# Altium footprint library SAMTEC SMD.PcbLib: 165 footprints (part 11 of 17) (continued)
## SAMTEC_QTE-080-01-L-D-A-K-TR [mm] "160 Contacts Female, Pitch 0.8mm, Straight Double Row High Speed Ground Plane Header" (continued)
Mechanical 15:
  lines w0.05: -40.255,-4.06 -40.255,4.06 40.255,4.06 40.255,-4.06 -40.255,-4.06
3D body "SAMTEC_QTE-080-01-L-D-A-K-TR.stp": height 4.27, standoff -0.71, extent -40.005,-3.556 40.005,3.556

## SAMTEC_QTH-020-02-L-D-DP-A [mm] "40 Contacts (20 Differential Pairs) + 4 Ground, Pitch 0.5mm, Straight Double Row, High Speed Ground Plane Header"
height 7.26
pads (46):
  rect 0.305x1.45 smd mask+0: 3(-6.75,3.086) 4(-6.75,-3.086) 5(-6.25,3.086) 6(-6.25,-3.086) 9(-5.25,3.086) 10(-5.25,-3.086) 11(-4.75,3.086) 12(-4.75,-3.086) 15(-3.75,3.086) 16(-3.75,-3.086) 17(-3.25,3.086) 18(-3.25,-3.086) 21(-2.25,3.086) 22(-2.25,-3.086) 23(-1.75,3.086) 24(-1.75,-3.086) 27(-0.75,3.086) 28(-0.75,-3.086) 29(-0.25,3.086) 30(-0.25,-3.086) 33(0.75,3.086) 34(0.75,-3.086) 35(1.25,3.086) 36(1.25,-3.086) 39(2.25,3.086) 40(2.25,-3.086) 41(2.75,3.086) 42(2.75,-3.086) 45(3.75,3.086) 46(3.75,-3.086) 47(4.25,3.086) 48(4.25,-3.086) 51(5.25,3.086) 52(5.25,-3.086) 53(5.75,3.086) 54(5.75,-3.086) 57(6.75,3.086) 58(6.75,-3.086) 59(7.25,3.086) 60(7.25,-3.086)
  rect 2.54x0.64 smd mask+0: 61(-8.445,0) 64(8.445,0)
  rect 4.7x0.64 smd mask+0: 62(-3.175,0) 63(3.175,0)
  round 0.5 hole 1 unplated mask+0.25: 65(-9.24,2.036) 66(9.24,2.036)
Top Overlay:
  circle w0.25: c-7.892,4.047 r0.125
  lines w0.2: -10.013,-0.67 -10.013,-1.46 -8.489,-2.984 -7.253,-2.984 ; -10.013,0.67 -10.013,1.683 ; -10.013,2.389 -10.013,2.984 -7.253,2.984 ; -8.45,-0.67 -8.45,-1.968 -7.253,-1.968 ; -8.45,0.67 -8.45,1.722 ; -8.393,1.968 -7.253,1.968 ; -6.825,-0.191 -5.875,-0.191 ; -6.825,0.191 -5.875,0.191 ; -0.475,-0.191 0.475,-0.191 ; -0.475,0.191 0.475,0.191 ; 5.875,-0.191 6.825,-0.191 ; 5.875,0.191 6.825,0.191 ; 7.752,-2.984 8.478,-2.984 10.002,-1.46 10.002,-0.67 ; 7.752,-1.968 8.441,-1.968 8.441,-0.67 ; 7.752,1.968 8.393,1.968 ; 7.752,2.984 10.002,2.984 10.002,2.413 ; 8.441,0.67 8.441,1.746 ; 10.002,0.67 10.002,1.659
Mechanical 8:
  drawing of 279 lines, arcs and shapes, not listed
Mechanical 14:
  drawing of 203 lines, arcs and shapes, not listed
Mechanical 15:
  lines w0.05: -10.263,-4.061 -10.263,4.061 10.252,4.061 10.252,-4.061 -10.263,-4.061
3D body "SAMTEC_QTH-020-02-L-D-DP-A.stp": height 7.27, standoff -0.76, extent -10.013,-3.556 10.002,3.556

## SAMTEC_QTH-030-01-L-D-A [mm] "60 (2x30) Contacts, Pitch 0.5mm, Straight Double Row High Speed Ground Plane Header (Lead Style 4.27mm)"
height 4.27
pads (66):
  rect 0.305x1.45 smd mask+0: 1(-7.25,3.086) 2(-7.25,-3.086) 3(-6.75,3.086) 4(-6.75,-3.086) 5(-6.25,3.086) 6(-6.25,-3.086) 7(-5.75,3.086) 8(-5.75,-3.086) 9(-5.25,3.086) 10(-5.25,-3.086) 11(-4.75,3.086) 12(-4.75,-3.086) 13(-4.25,3.086) 14(-4.25,-3.086) 15(-3.75,3.086) 16(-3.75,-3.086) 17(-3.25,3.086) 18(-3.25,-3.086) 19(-2.75,3.086) 20(-2.75,-3.086) 21(-2.25,3.086) 22(-2.25,-3.086) 23(-1.75,3.086) 24(-1.75,-3.086) 25(-1.25,3.086) 26(-1.25,-3.086) 27(-0.75,3.086) 28(-0.75,-3.086) 29(-0.25,3.086) 30(-0.25,-3.086) 31(0.25,3.086) 32(0.25,-3.086) 33(0.75,3.086) 34(0.75,-3.086) 35(1.25,3.086) 36(1.25,-3.086) 37(1.75,3.086) 38(1.75,-3.086) 39(2.25,3.086) 40(2.25,-3.086) 41(2.75,3.086) 42(2.75,-3.086) 43(3.25,3.086) 44(3.25,-3.086) 45(3.75,3.086) 46(3.75,-3.086) 47(4.25,3.086) 48(4.25,-3.086) 49(4.75,3.086) 50(4.75,-3.086) 51(5.25,3.086) 52(5.25,-3.086) 53(5.75,3.086) 54(5.75,-3.086) 55(6.25,3.086) 56(6.25,-3.086) 57(6.75,3.086) 58(6.75,-3.086) 59(7.25,3.086) 60(7.25,-3.086)
  rect 2.54x0.64 smd mask+0: 61(-8.445,0) 64(8.445,0)
  rect 4.7x0.64 smd mask+0: 62(-3.175,0) 63(3.175,0)
  round 0.5 hole 1 unplated mask+0.25: 65(-9.24,2.036) 66(9.24,2.036)
Top Overlay:
  circle w0.25: c-7.892,4.047 r0.125
  lines w0.2: -8.447,-0.72 -8.447,-1.968 8.447,-1.968 8.447,-0.72 ; -8.447,0.72 -8.447,1.611 ; -8.342,1.968 8.343,1.968 ; -7.802,-2.985 -8.477,-2.985 -10.001,-1.46 -10.001,2.985 -7.802,2.985 ; 7.803,-2.985 8.477,-2.985 10.001,-1.46 10.001,2.985 7.803,2.985 ; 8.447,0.72 8.447,1.611
Mechanical 8:
  drawing of 399 lines, arcs and shapes, not listed
Mechanical 14:
  circle w0.1: c-7.89,4.047 r0.25
  lines w0.1: -8.731,-0.191 -8.731,-0.635 -9.747,-0.635 -9.747,0.635 -8.731,0.635 -8.731,0.191 ; -8.447,-0.572 -8.03,-0.572 -8.03,-0.193 ; -8.447,0.572 -8.03,0.572 -8.03,0.193 ; 8.447,-0.572 8.03,-0.572 8.03,0.572 8.447,0.572 ; 8.731,-0.191 8.731,-0.635 9.747,-0.635 9.747,0.635 8.731,0.635 8.731,0.191 ; -10.001,-1.46 -8.477,-2.985 8.477,-2.985 10.001,-1.46 10.001,2.985 -10.001,2.985 -10.001,-1.46 ; -9.461,-0.191 -9.461,0.191 9.462,0.191 9.462,-0.191 -9.461,-0.191 ; -8.447,-1.968 -8.447,1.968 8.447,1.968 8.447,-1.968 -8.447,-1.968
Mechanical 15:
  lines w0.1: -10.251,-4.061 -10.251,4.061 10.251,4.061 10.251,-4.061 -10.251,-4.061
3D body "SAMTEC_QTH-030-01-L-D-A.stp": height 4.27, standoff -0.74, extent -10.001,-3.569 10.001,3.569

## SAMTEC_QTH-030-02-L-D-A [mm] "60 (2x30) Contacts, Pitch 0.5mm, Straight Double Row High Speed Ground Plane Header (Lead Style 7.26mm)"
height 4.27
pads (66):
  rect 0.305x1.45 smd mask+0: 1(-7.25,3.086) 2(-7.25,-3.086) 3(-6.75,3.086) 4(-6.75,-3.086) 5(-6.25,3.086) 6(-6.25,-3.086) 7(-5.75,3.086) 8(-5.75,-3.086) 9(-5.25,3.086) 10(-5.25,-3.086) 11(-4.75,3.086) 12(-4.75,-3.086) 13(-4.25,3.086) 14(-4.25,-3.086) 15(-3.75,3.086) 16(-3.75,-3.086) 17(-3.25,3.086) 18(-3.25,-3.086) 19(-2.75,3.086) 20(-2.75,-3.086) 21(-2.25,3.086) 22(-2.25,-3.086) 23(-1.75,3.086) 24(-1.75,-3.086) 25(-1.25,3.086) 26(-1.25,-3.086) 27(-0.75,3.086) 28(-0.75,-3.086) 29(-0.25,3.086) 30(-0.25,-3.086) 31(0.25,3.086) 32(0.25,-3.086) 33(0.75,3.086) 34(0.75,-3.086) 35(1.25,3.086) 36(1.25,-3.086) 37(1.75,3.086) 38(1.75,-3.086) 39(2.25,3.086) 40(2.25,-3.086) 41(2.75,3.086) 42(2.75,-3.086) 43(3.25,3.086) 44(3.25,-3.086) 45(3.75,3.086) 46(3.75,-3.086) 47(4.25,3.086) 48(4.25,-3.086) 49(4.75,3.086) 50(4.75,-3.086) 51(5.25,3.086) 52(5.25,-3.086) 53(5.75,3.086) 54(5.75,-3.086) 55(6.25,3.086) 56(6.25,-3.086) 57(6.75,3.086) 58(6.75,-3.086) 59(7.25,3.086) 60(7.25,-3.086)
  rect 2.54x0.64 smd mask+0: 61(-8.445,0) 64(8.445,0)
  rect 4.7x0.64 smd mask+0: 62(-3.175,0) 63(3.175,0)
  round 0.5 hole 1 unplated mask+0.25: 65(-9.24,2.036) 66(9.24,2.036)
Top Overlay:
  circle w0.25: c-7.892,4.047 r0.125
  lines w0.2: -8.447,-0.72 -8.447,-1.968 8.447,-1.968 8.447,-0.72 ; -8.447,0.72 -8.447,1.611 ; -8.342,1.968 8.343,1.968 ; -7.802,-2.985 -8.477,-2.985 -10.001,-1.46 -10.001,2.985 -7.802,2.985 ; 7.803,-2.985 8.477,-2.985 10.001,-1.46 10.001,2.985 7.803,2.985 ; 8.447,0.72 8.447,1.611
Mechanical 8:
  drawing of 399 lines, arcs and shapes, not listed
Mechanical 14:
  circle w0.1: c-7.89,4.047 r0.25
  lines w0.1: -8.731,-0.191 -8.731,-0.635 -9.747,-0.635 -9.747,0.635 -8.731,0.635 -8.731,0.191 ; -8.447,-0.572 -8.03,-0.572 -8.03,-0.193 ; -8.447,0.572 -8.03,0.572 -8.03,0.193 ; 8.447,-0.572 8.03,-0.572 8.03,0.572 8.447,0.572 ; 8.731,-0.191 8.731,-0.635 9.747,-0.635 9.747,0.635 8.731,0.635 8.731,0.191 ; -10.001,-1.46 -8.477,-2.985 8.477,-2.985 10.001,-1.46 10.001,2.985 -10.001,2.985 -10.001,-1.46 ; -9.461,-0.191 -9.461,0.191 9.462,0.191 9.462,-0.191 -9.461,-0.191 ; -8.447,-1.968 -8.447,1.968 8.447,1.968 8.447,-1.968 -8.447,-1.968
Mechanical 15:
  lines w0.1: -10.251,-4.061 -10.251,4.061 10.251,4.061 10.251,-4.061 -10.251,-4.061
3D body "SAMTEC_QTH-030-02-L-D-A.stp": height 7.26, standoff -0.74, extent -10.001,-3.568 10.001,3.569

## SAMTEC_QTH-030-04-L-D-A [mm] "60 (2x30) Contacts, Pitch 0.5mm, Straight Double Row High Speed Ground Plane Header (Lead Style 15.25mm)"
height 15.25
pads (66):
  rect 0.305x1.45 smd mask+0: 1(-7.25,3.086) 2(-7.25,-3.086) 3(-6.75,3.086) 4(-6.75,-3.086) 5(-6.25,3.086) 6(-6.25,-3.086) 7(-5.75,3.086) 8(-5.75,-3.086) 9(-5.25,3.086) 10(-5.25,-3.086) 11(-4.75,3.086) 12(-4.75,-3.086) 13(-4.25,3.086) 14(-4.25,-3.086) 15(-3.75,3.086) 16(-3.75,-3.086) 17(-3.25,3.086) 18(-3.25,-3.086) 19(-2.75,3.086) 20(-2.75,-3.086) 21(-2.25,3.086) 22(-2.25,-3.086) 23(-1.75,3.086) 24(-1.75,-3.086) 25(-1.25,3.086) 26(-1.25,-3.086) 27(-0.75,3.086) 28(-0.75,-3.086) 29(-0.25,3.086) 30(-0.25,-3.086) 31(0.25,3.086) 32(0.25,-3.086) 33(0.75,3.086) 34(0.75,-3.086) 35(1.25,3.086) 36(1.25,-3.086) 37(1.75,3.086) 38(1.75,-3.086) 39(2.25,3.086) 40(2.25,-3.086) 41(2.75,3.086) 42(2.75,-3.086) 43(3.25,3.086) 44(3.25,-3.086) 45(3.75,3.086) 46(3.75,-3.086) 47(4.25,3.086) 48(4.25,-3.086) 49(4.75,3.086) 50(4.75,-3.086) 51(5.25,3.086) 52(5.25,-3.086) 53(5.75,3.086) 54(5.75,-3.086) 55(6.25,3.086) 56(6.25,-3.086) 57(6.75,3.086) 58(6.75,-3.086) 59(7.25,3.086) 60(7.25,-3.086)
  rect 2.54x0.64 smd mask+0: 61(-8.445,0) 64(8.445,0)
  rect 4.7x0.64 smd mask+0: 62(-3.175,0) 63(3.175,0)
  round 0.5 hole 1 unplated mask+0.25: 65(-9.24,2.036) 66(9.24,2.036)
Top Overlay:
  circle w0.25: c-7.892,4.047 r0.125
  lines w0.2: -8.447,-0.72 -8.447,-1.968 8.447,-1.968 8.447,-0.72 ; -8.447,0.72 -8.447,1.611 ; -8.342,1.968 8.343,1.968 ; -7.802,-3.366 -8.096,-3.366 -10.001,-1.46 -10.001,3.366 -7.802,3.366 ; 7.803,-3.366 8.096,-3.366 10.001,-1.46 10.001,3.366 7.803,3.366 ; 8.447,0.72 8.447,1.611
Mechanical 8:
  drawing of 399 lines, arcs and shapes, not listed
Mechanical 14:
  circle w0.1: c-7.89,4.047 r0.25
  lines w0.1: -8.731,-0.191 -8.731,-0.635 -9.747,-0.635 -9.747,0.635 -8.731,0.635 -8.731,0.191 ; -8.447,-0.572 -8.03,-0.572 -8.03,-0.193 ; -8.447,0.572 -8.03,0.572 -8.03,0.193 ; 8.447,-0.572 8.03,-0.572 8.03,0.572 8.447,0.572 ; 8.731,-0.191 8.731,-0.635 9.747,-0.635 9.747,0.635 8.731,0.635 8.731,0.191 ; -10.001,-1.46 -8.096,-3.366 8.096,-3.366 10.001,-1.46 10.001,3.366 -10.001,3.366 -10.001,-1.46 ; -9.461,-0.191 -9.461,0.191 9.462,0.191 9.462,-0.191 -9.461,-0.191 ; -8.447,-1.968 -8.447,1.968 8.447,1.968 8.447,-1.968 -8.447,-1.968
Mechanical 15:
  lines w0.05: -10.251,-4.061 -10.251,4.061 10.251,4.061 10.251,-4.061 -10.251,-4.061
3D body "SAMTEC_QTH-030-04-L-D-A.stp": height 15.25, standoff -0.74, extent -10.001,-3.569 10.001,3.569

## SAMTEC_QTH-060-04-L-D-A [mm] "120 (2x60) Contacts, Pitch 0.5mm, Straight Double Row High Speed Ground Plane Header (Lead Style 15.25mm)"
height 15.25
pads (130):
  rect 0.305x1.45 smd mask+0: 1(-17.252,3.086) 2(-17.252,-3.086) 3(-16.752,3.086) 4(-16.752,-3.086) 5(-16.252,3.086) 6(-16.252,-3.086) 7(-15.752,3.086) 8(-15.752,-3.086) 9(-15.252,3.086) 10(-15.252,-3.086) 11(-14.752,3.086) 12(-14.752,-3.086) 13(-14.252,3.086) 14(-14.252,-3.086) 15(-13.752,3.086) 16(-13.752,-3.086) 17(-13.252,3.086) 18(-13.252,-3.086) 19(-12.752,3.086) 20(-12.752,-3.086) 21(-12.252,3.086) 22(-12.252,-3.086) 23(-11.752,3.086) 24(-11.752,-3.086) 25(-11.252,3.086) 26(-11.252,-3.086) 27(-10.752,3.086) 28(-10.752,-3.086) 29(-10.252,3.086) 30(-10.252,-3.086) 31(-9.752,3.086) 32(-9.752,-3.086) 33(-9.252,3.086) 34(-9.252,-3.086) 35(-8.752,3.086) 36(-8.752,-3.086) 37(-8.252,3.086) 38(-8.252,-3.086) 39(-7.752,3.086) 40(-7.752,-3.086) 41(-7.252,3.086) 42(-7.252,-3.086) 43(-6.752,3.086) 44(-6.752,-3.086) 45(-6.252,3.086) 46(-6.252,-3.086) 47(-5.752,3.086) 48(-5.752,-3.086) 49(-5.252,3.086) 50(-5.252,-3.086) 51(-4.752,3.086) 52(-4.752,-3.086) 53(-4.252,3.086) 54(-4.252,-3.086) 55(-3.752,3.086) 56(-3.752,-3.086) 57(-3.252,3.086) 58(-3.252,-3.086) 59(-2.752,3.086) 60(-2.752,-3.086) 61(2.752,3.086) 62(2.752,-3.086) 63(3.251,3.086) 64(3.251,-3.086) 65(3.751,3.086) 66(3.751,-3.086) 67(4.252,3.086) 68(4.252,-3.086) 69(4.752,3.086) 70(4.752,-3.086) 71(5.252,3.086) 72(5.252,-3.086) 73(5.751,3.086) 74(5.751,-3.086) 75(6.251,3.086) 76(6.251,-3.086) 77(6.752,3.086) 78(6.752,-3.086) 79(7.252,3.086) 80(7.252,-3.086) 81(7.752,3.086) 82(7.752,-3.086) 83(8.251,3.086) 84(8.251,-3.086) 85(8.751,3.086) 86(8.751,-3.086) 87(9.252,3.086) 88(9.252,-3.086) 89(9.751,3.086) 90(9.751,-3.086) 91(10.252,3.086) 92(10.252,-3.086) 93(10.751,3.086) 94(10.751,-3.086) 95(11.252,3.086) 96(11.252,-3.086) 97(11.752,3.086) 98(11.752,-3.086) 99(12.251,3.086) 100(12.251,-3.086) 101(12.752,3.086) 102(12.752,-3.086) 103(13.252,3.086) 104(13.252,-3.086) 105(13.751,3.086) 106(13.751,-3.086) 107(14.252,3.086) 108(14.252,-3.086) 109(14.751,3.086) 110(14.751,-3.086) 111(15.252,3.086) 112(15.252,-3.086) 113(15.752,3.086) 114(15.752,-3.086) 115(16.251,3.086) 116(16.251,-3.086) 117(16.752,3.086) 118(16.752,-3.086) 119(17.251,3.086) 120(17.251,-3.086)
  rect 2.54x0.64 smd mask+0: 121(-18.447,0) 124(-1.557,0) 125(1.557,0) 128(18.447,0)
  rect 4.7x0.64 smd mask+0: 122(-13.177,0) 123(-6.827,0) 126(6.827,0) 127(13.177,0)
  round 0.5 hole 1 unplated mask+0.25: 129(-19.242,2.032) 130(19.242,2.032)
Top Overlay:
  circle w0.25: c-17.894,4.047 r0.125
  lines w0.2: -20.003,1.551 -20.003,-1.46 -18.098,-3.366 -17.804,-3.366 ; -20.003,2.513 -20.003,3.366 -17.804,3.366 ; -20.003,2.985 -17.804,2.985 ; -18.479,-2.985 -17.804,-2.985 ; -18.448,-0.72 -18.448,-1.968 -1.554,-1.968 -1.554,-0.72 ; -18.448,0.72 -18.448,1.608 ; -18.344,1.968 -1.554,1.968 -1.554,0.72 ; -2.199,-3.366 2.199,-3.366 ; -2.199,-2.985 2.199,-2.985 ; -2.199,2.985 2.199,2.985 ; -2.199,3.366 2.199,3.366 ; 1.554,-0.72 1.554,-1.968 18.448,-1.968 18.448,-0.72 ; 1.554,0.72 1.554,1.968 18.344,1.968 ; 17.804,-3.366 18.098,-3.366 20.003,-1.46 20.003,1.551 ; 17.804,-2.985 18.479,-2.985 ; 17.804,2.985 20.003,2.985 ; 17.804,3.366 20.003,3.366 20.003,2.513 ; 18.448,0.72 18.448,1.608
Mechanical 8:
  drawing of 782 lines, arcs and shapes, not listed
Mechanical 14:
  circle w0.1: c-17.892,4.047 r0.25
  lines w0.1: -20.003,2.985 20.003,2.985 ; -18.479,-2.985 18.479,-2.985 ; -18.448,-0.572 -18.031,-0.572 -18.031,-0.193 ; -18.448,0.572 -18.031,0.572 -18.031,0.193 ; -1.971,-0.193 -1.971,-0.572 -1.554,-0.572 ; -1.971,0.193 -1.971,0.572 -1.554,0.572 ; 1.554,-0.572 1.971,-0.572 1.971,-0.193 ; 1.554,0.572 1.971,0.572 1.971,0.193 ; 18.031,-0.193 18.031,-0.572 18.448,-0.572 ; 18.448,0.572 18.031,0.572 18.031,0.193 18.183,0.193 ; 18.183,0.193 18.183,-0.193 1.82,-0.193 1.82,0.193 18.183,0.193 ; -20.003,-1.46 -18.098,-3.366 18.098,-3.366 20.003,-1.46 20.003,3.366 -20.003,3.366 -20.003,-1.46 ; -19.749,-0.635 -18.733,-0.635 -18.733,0.635 -19.749,0.635 -19.749,-0.635 ; -18.448,-1.968 -18.448,1.968 -1.554,1.968 -1.554,-1.968 -18.448,-1.968 ; -18.183,-0.193 -18.183,0.193 -1.82,0.193 -1.82,-0.193 -18.183,-0.193 ; -1.079,-0.635 1.079,-0.635 1.079,0.635 -1.079,0.635 -1.079,-0.635 ; 1.554,-1.968 18.448,-1.968 18.448,1.968 1.554,1.968 1.554,-1.968 ; 18.733,-0.635 19.749,-0.635 19.749,0.635 18.733,0.635 18.733,-0.635
Mechanical 15:
  lines w0.05: -20.253,-4.061 -20.253,4.061 20.253,4.061 20.253,-4.061 -20.253,-4.061
3D body "SAMTEC_QTH-060-04-L-D-A.stp": height 15.25, standoff -0.73, extent -20.002,-3.569 20.003,3.569

## SAMTEC_QTH-060-07-L-D-A [mm] "120 (2x60) Contacts, Pitch 0.5mm, Straight Double Row High Speed Ground Plane Header (Lead Style 25.00mm)"
height 25
pads (130):
  rect 0.305x1.45 smd mask+0: 1(-17.252,3.086) 2(-17.252,-3.086) 3(-16.752,3.086) 4(-16.752,-3.086) 5(-16.252,3.086) 6(-16.252,-3.086) 7(-15.752,3.086) 8(-15.752,-3.086) 9(-15.252,3.086) 10(-15.252,-3.086) 11(-14.752,3.086) 12(-14.752,-3.086) 13(-14.252,3.086) 14(-14.252,-3.086) 15(-13.752,3.086) 16(-13.752,-3.086) 17(-13.252,3.086) 18(-13.252,-3.086) 19(-12.752,3.086) 20(-12.752,-3.086) 21(-12.252,3.086) 22(-12.252,-3.086) 23(-11.752,3.086) 24(-11.752,-3.086) 25(-11.252,3.086) 26(-11.252,-3.086) 27(-10.752,3.086) 28(-10.752,-3.086) 29(-10.252,3.086) 30(-10.252,-3.086) 31(-9.752,3.086) 32(-9.752,-3.086) 33(-9.252,3.086) 34(-9.252,-3.086) 35(-8.752,3.086) 36(-8.752,-3.086) 37(-8.252,3.086) 38(-8.252,-3.086) 39(-7.752,3.086) 40(-7.752,-3.086) 41(-7.252,3.086) 42(-7.252,-3.086) 43(-6.752,3.086) 44(-6.752,-3.086) 45(-6.252,3.086) 46(-6.252,-3.086) 47(-5.752,3.086) 48(-5.752,-3.086) 49(-5.252,3.086) 50(-5.252,-3.086) 51(-4.752,3.086) 52(-4.752,-3.086) 53(-4.252,3.086) 54(-4.252,-3.086) 55(-3.752,3.086) 56(-3.752,-3.086) 57(-3.252,3.086) 58(-3.252,-3.086) 59(-2.752,3.086) 60(-2.752,-3.086) 61(2.752,3.086) 62(2.752,-3.086) 63(3.251,3.086) 64(3.251,-3.086) 65(3.751,3.086) 66(3.751,-3.086) 67(4.252,3.086) 68(4.252,-3.086) 69(4.752,3.086) 70(4.752,-3.086) 71(5.252,3.086) 72(5.252,-3.086) 73(5.751,3.086) 74(5.751,-3.086) 75(6.251,3.086) 76(6.251,-3.086) 77(6.752,3.086) 78(6.752,-3.086) 79(7.252,3.086) 80(7.252,-3.086) 81(7.752,3.086) 82(7.752,-3.086) 83(8.251,3.086) 84(8.251,-3.086) 85(8.751,3.086) 86(8.751,-3.086) 87(9.252,3.086) 88(9.252,-3.086) 89(9.751,3.086) 90(9.751,-3.086) 91(10.252,3.086) 92(10.252,-3.086) 93(10.751,3.086) 94(10.751,-3.086) 95(11.252,3.086) 96(11.252,-3.086) 97(11.752,3.086) 98(11.752,-3.086) 99(12.251,3.086) 100(12.251,-3.086) 101(12.752,3.086) 102(12.752,-3.086) 103(13.252,3.086) 104(13.252,-3.086) 105(13.751,3.086) 106(13.751,-3.086) 107(14.252,3.086) 108(14.252,-3.086) 109(14.751,3.086) 110(14.751,-3.086) 111(15.252,3.086) 112(15.252,-3.086) 113(15.752,3.086) 114(15.752,-3.086) 115(16.251,3.086) 116(16.251,-3.086) 117(16.752,3.086) 118(16.752,-3.086) 119(17.251,3.086) 120(17.251,-3.086)
  rect 2.54x0.64 smd mask+0: 121(-18.447,0) 124(-1.557,0) 125(1.557,0) 128(18.447,0)
  rect 4.7x0.64 smd mask+0: 122(-13.177,0) 123(-6.827,0) 126(6.827,0) 127(13.177,0)
  round 0.5 hole 1 unplated mask+0.25: 129(-19.242,2.032) 130(19.242,2.032)
Top Overlay:
  circle w0.25: c-17.894,4.047 r0.125
  lines w0.2: -20.003,1.551 -20.003,-1.46 -18.098,-3.366 -17.804,-3.366 ; -20.003,2.513 -20.003,3.366 -17.804,3.366 ; -20.003,2.985 -17.804,2.985 ; -18.479,-2.985 -17.804,-2.985 ; -18.448,-0.72 -18.448,-1.968 -1.554,-1.968 -1.554,-0.72 ; -18.448,0.72 -18.448,1.608 ; -18.344,1.968 -1.554,1.968 -1.554,0.72 ; -2.199,-3.366 2.199,-3.366 ; -2.199,-2.985 2.199,-2.985 ; -2.199,2.985 2.199,2.985 ; -2.199,3.366 2.199,3.366 ; 1.554,-0.72 1.554,-1.968 18.448,-1.968 18.448,-0.72 ; 1.554,0.72 1.554,1.968 18.344,1.968 ; 17.804,-3.366 18.098,-3.366 20.003,-1.46 20.003,1.551 ; 17.804,-2.985 18.479,-2.985 ; 17.804,2.985 20.003,2.985 ; 17.804,3.366 20.003,3.366 20.003,2.513 ; 18.448,0.72 18.448,1.608
Mechanical 8:
  drawing of 782 lines, arcs and shapes, not listed
Mechanical 14:
  circle w0.1: c-17.892,4.047 r0.25
  lines w0.1: -20.003,2.985 20.003,2.985 ; -18.479,-2.985 18.479,-2.985 ; -18.448,-0.572 -18.031,-0.572 -18.031,-0.193 ; -18.448,0.572 -18.031,0.572 -18.031,0.193 ; -1.971,-0.193 -1.971,-0.572 -1.554,-0.572 ; -1.971,0.193 -1.971,0.572 -1.554,0.572 ; 1.554,-0.572 1.971,-0.572 1.971,-0.193 ; 1.554,0.572 1.971,0.572 1.971,0.193 ; 18.031,-0.193 18.031,-0.572 18.448,-0.572 ; 18.448,0.572 18.031,0.572 18.031,0.193 18.183,0.193 ; 18.183,0.193 1.82,0.193 1.82,-0.193 18.183,-0.193 18.183,0.193 ; -20.003,-1.46 -20.003,3.366 20.003,3.366 20.003,-1.46 18.098,-3.366 -18.098,-3.366 -20.003,-1.46 ; -19.749,-0.635 -19.749,0.635 -18.733,0.635 -18.733,-0.635 -19.749,-0.635 ; -18.448,-1.968 -1.554,-1.968 -1.554,1.968 -18.448,1.968 -18.448,-1.968 ; -18.183,-0.193 -1.82,-0.193 -1.82,0.193 -18.183,0.193 -18.183,-0.193 ; -1.079,-0.635 -1.079,0.635 1.079,0.635 1.079,-0.635 -1.079,-0.635 ; 1.554,-1.968 1.554,1.968 18.448,1.968 18.448,-1.968 1.554,-1.968 ; 18.733,-0.635 18.733,0.635 19.749,0.635 19.749,-0.635 18.733,-0.635
Mechanical 15:
  lines w0.05: -20.253,-4.061 20.253,-4.061 20.253,4.061 -20.253,4.061 -20.253,-4.061
3D body "SAMTEC_QTH-060-07-L-D-A.stp": height 24.24, standoff -0.73, extent -20.002,-3.569 20.003,3.569

## SAMTEC_QTH-090-01-L-D-A [mm] "180 (3x60) Contacts, Pitch 0.5mm, Straight Double Row High Speed Ground Plane Header"
height 4.27
pads (194):
  rect 0.305x1.45 smd mask+0: 1(-27.253,3.086) 2(-27.253,-3.086) 3(-26.753,3.086) 4(-26.753,-3.086) 5(-26.253,3.086) 6(-26.253,-3.086) 7(-25.753,3.086) 8(-25.753,-3.086) 9(-25.253,3.086) 10(-25.253,-3.086) 11(-24.753,3.086) 12(-24.753,-3.086) 13(-24.253,3.086) 14(-24.253,-3.086) 15(-23.753,3.086) 16(-23.753,-3.086) 17(-23.253,3.086) 18(-23.253,-3.086) 19(-22.753,3.086) 20(-22.753,-3.086) 21(-22.253,3.086) 22(-22.253,-3.086) 23(-21.753,3.086) 24(-21.753,-3.086) 25(-21.253,3.086) 26(-21.253,-3.086) 27(-20.753,3.086) 28(-20.753,-3.086) 29(-20.253,3.086) 30(-20.253,-3.086) 31(-19.753,3.086) 32(-19.753,-3.086) 33(-19.253,3.086) 34(-19.253,-3.086) 35(-18.753,3.086) 36(-18.753,-3.086) 37(-18.253,3.086) 38(-18.253,-3.086) 39(-17.753,3.086) 40(-17.753,-3.086) 41(-17.253,3.086) 42(-17.253,-3.086) 43(-16.753,3.086) 44(-16.753,-3.086) 45(-16.253,3.086) 46(-16.253,-3.086) 47(-15.753,3.086) 48(-15.753,-3.086) 49(-15.253,3.086) 50(-15.253,-3.086) 51(-14.753,3.086) 52(-14.753,-3.086) 53(-14.253,3.086) 54(-14.253,-3.086) 55(-13.753,3.086) 56(-13.753,-3.086) 57(-13.253,3.086) 58(-13.253,-3.086) 59(-12.753,3.086) 60(-12.753,-3.086) 61(-7.25,3.086) 62(-7.25,-3.086) 63(-6.75,3.086) 64(-6.75,-3.086) 65(-6.25,3.086) 66(-6.25,-3.086) 67(-5.75,3.086) 68(-5.75,-3.086) 69(-5.25,3.086) 70(-5.25,-3.086) 71(-4.75,3.086) 72(-4.75,-3.086) 73(-4.25,3.086) 74(-4.25,-3.086) 75(-3.75,3.086) 76(-3.75,-3.086) 77(-3.25,3.086) 78(-3.25,-3.086) 79(-2.75,3.086) 80(-2.75,-3.086) 81(-2.25,3.086) 82(-2.25,-3.086) 83(-1.75,3.086) 84(-1.75,-3.086) 85(-1.25,3.086) 86(-1.25,-3.086) 87(-0.75,3.086) 88(-0.75,-3.086) 89(-0.25,3.086) 90(-0.25,-3.086) 91(0.25,3.086) 92(0.25,-3.086) 93(0.75,3.086) 94(0.75,-3.086) 95(1.25,3.086) 96(1.25,-3.086) 97(1.75,3.086) 98(1.75,-3.086) 99(2.25,3.086) 100(2.25,-3.086) 101(2.75,3.086) 102(2.75,-3.086) 103(3.25,3.086) 104(3.25,-3.086) 105(3.75,3.086) 106(3.75,-3.086) 107(4.25,3.086) 108(4.25,-3.086) 109(4.75,3.086) 110(4.75,-3.086) 111(5.25,3.086) 112(5.25,-3.086) 113(5.75,3.086) 114(5.75,-3.086) 115(6.25,3.086) 116(6.25,-3.086) 117(6.75,3.086) 118(6.75,-3.086) 119(7.25,3.086) 120(7.25,-3.086) 121(12.753,3.086) 122(12.753,-3.086) 123(13.253,3.086) 124(13.253,-3.086) 125(13.753,3.086) 126(13.753,-3.086) 127(14.253,3.086) 128(14.253,-3.086) 129(14.753,3.086) 130(14.753,-3.086) 131(15.253,3.086) 132(15.253,-3.086) 133(15.753,3.086) 134(15.753,-3.086) 135(16.253,3.086) 136(16.253,-3.086) 137(16.753,3.086) 138(16.753,-3.086) 139(17.253,3.086) 140(17.253,-3.086) 141(17.753,3.086) 142(17.753,-3.086) 143(18.253,3.086) 144(18.253,-3.086) 145(18.753,3.086) 146(18.753,-3.086) 147(19.253,3.086) 148(19.253,-3.086) 149(19.753,3.086) 150(19.753,-3.086) 151(20.253,3.086) 152(20.253,-3.086) 153(20.753,3.086) 154(20.753,-3.086) 155(21.253,3.086) 156(21.253,-3.086) 157(21.753,3.086) 158(21.753,-3.086) 159(22.253,3.086) 160(22.253,-3.086) 161(22.753,3.086) 162(22.753,-3.086) 163(23.253,3.086) 164(23.253,-3.086) 165(23.753,3.086) 166(23.753,-3.086) 167(24.253,3.086) 168(24.253,-3.086) 169(24.753,3.086) 170(24.753,-3.086) 171(25.253,3.086) 172(25.253,-3.086) 173(25.753,3.086) 174(25.753,-3.086) 175(26.253,3.086) 176(26.253,-3.086) 177(26.753,3.086) 178(26.753,-3.086) 179(27.253,3.086) 180(27.253,-3.086)
  rect 2.54x0.64 smd mask+0: 181(-28.448,0) 184(-11.558,0) 185(-8.445,0) 188(8.445,0) 189(11.558,0) 192(28.448,0)
  rect 4.7x0.64 smd mask+0: 182(-23.178,0) 183(-16.828,0) 186(-3.175,0) 187(3.175,0) 190(16.828,0) 191(23.178,0)
  round 0.5 hole 1 unplated mask+0.25: 193(-29.244,2.032) 194(29.244,2.032)
Top Overlay:
  lines w0.2: -29.976,1.509 -29.976,-1.639 -28.453,-2.982 -27.805,-2.982 ; -29.976,2.555 -29.976,2.982 -27.805,2.982 ; -28.422,-0.72 -28.422,-1.967 -11.542,-1.967 -11.542,-0.72 ; -28.422,0.72 -28.422,1.664 ; -28.346,1.967 -11.542,1.967 -11.542,0.72 ; -12.2,-2.982 -7.802,-2.982 ; -12.2,2.982 -7.802,2.982 ; -8.435,-0.72 -8.435,-1.967 8.446,-1.967 8.446,-0.72 ; -8.435,0.72 -8.435,1.967 8.446,1.967 8.446,0.72 ; 7.802,-2.982 12.2,-2.982 ; 7.802,2.982 12.2,2.982 ; 11.537,-0.72 11.537,-1.967 28.417,-1.967 28.417,-0.72 ; 11.537,0.72 11.537,1.967 28.346,1.967 ; 27.805,-2.982 28.448,-2.982 29.971,-1.639 29.971,1.502 ; 27.805,2.982 29.971,2.982 29.971,2.562 ; 28.417,0.72 28.417,1.675
Mechanical 8:
  drawing of 1167 lines, arcs and shapes, not listed
Mechanical 14:
  lines w0.1: -28.707,-0.19 -29.436,-0.19 -29.436,0.19 -28.707,0.19 ; -28.422,-0.571 -28.006,-0.571 -28.006,-0.193 -28.157,-0.193 -28.157,0.193 -28.006,0.193 -28.006,0.571 -28.422,0.571 ; -11.542,-0.571 -11.958,-0.571 -11.958,-0.193 -11.807,-0.193 -11.807,0.193 -11.958,0.193 -11.958,0.571 -11.542,0.571 ; -11.067,-0.19 -10.528,-0.19 -10.528,0.19 -11.067,0.19 ; -8.91,-0.19 -9.449,-0.19 -9.449,0.19 -8.91,0.19 ; -8.435,-0.571 -8.019,-0.571 -8.019,-0.193 -8.17,-0.193 -8.17,0.193 -8.019,0.193 -8.019,0.571 -8.435,0.571 ; 8.446,-0.571 8.029,-0.571 8.029,-0.193 8.18,-0.193 8.18,0.193 8.029,0.193 8.029,0.571 8.446,0.571 ; 8.905,-0.635 11.062,-0.635 11.062,0.635 8.905,0.635 ; 8.92,-0.635 8.92,0.635 ; 8.92,-0.19 9.46,-0.19 9.46,0.19 8.92,0.19 ; 11.062,-0.19 10.523,-0.19 10.523,0.19 11.062,0.19 ; 11.537,-0.571 11.953,-0.571 11.953,-0.193 11.802,-0.193 11.802,0.193 11.953,0.193 11.953,0.571 11.537,0.571 ; 28.417,-0.571 28.001,-0.571 28.001,-0.193 28.152,-0.193 28.152,0.193 28.001,0.193 28.001,0.571 28.417,0.571 ; 28.702,-0.19 29.431,-0.19 29.431,0.19 28.702,0.19 ; -29.976,-1.639 -28.453,-2.982 28.448,-2.982 29.971,-1.639 29.971,2.982 -29.976,2.982 -29.976,-1.639 ; -29.722,-0.635 -28.707,-0.635 -28.707,0.631 -29.722,0.631 -29.722,-0.635 ; -28.422,-1.967 -11.542,-1.967 -11.542,1.967 -28.422,1.967 -28.422,-1.967 ; -28.155,-0.19 -11.809,-0.19 -11.809,0.19 -28.155,0.19 -28.155,-0.19 ; -11.067,-0.635 -8.91,-0.635 -8.91,0.635 -11.067,0.635 -11.067,-0.635 ; -8.435,-1.967 8.446,-1.967 8.446,1.967 -8.435,1.967 -8.435,-1.967 ; -8.167,-0.19 8.178,-0.19 8.178,0.19 -8.167,0.19 -8.167,-0.19 ; 11.537,-1.967 28.417,-1.967 28.417,1.967 11.537,1.967 11.537,-1.967 ; 11.804,-0.19 28.15,-0.19 28.15,0.19 11.804,0.19 11.804,-0.19 ; 28.702,-0.635 29.717,-0.635 29.717,0.635 28.702,0.635 28.702,-0.635
Mechanical 15:
  lines w0.05: -30.226,-4.061 -30.226,4.061 30.221,4.061 30.221,-4.061 -30.226,-4.061
3D body "SAMTEC_QTH-090-01-L-D-A.stp": height 4.27, standoff -0.73, extent -29.983,-3.553 29.979,3.553